# Altium footprint library pcb2D3D库101.PcbLib: 411 footprints (part 26 of 26)
Each footprint in its own frame and in the unit in brackets; x right, y up, seen from the top. Pads: shape width x height; smd on the part's side, far side on the other; paste and mask are expansions set on the pad; w line width, h text height; cw(c..) or ccw(c..) is an arc to the next point about the centre after c.
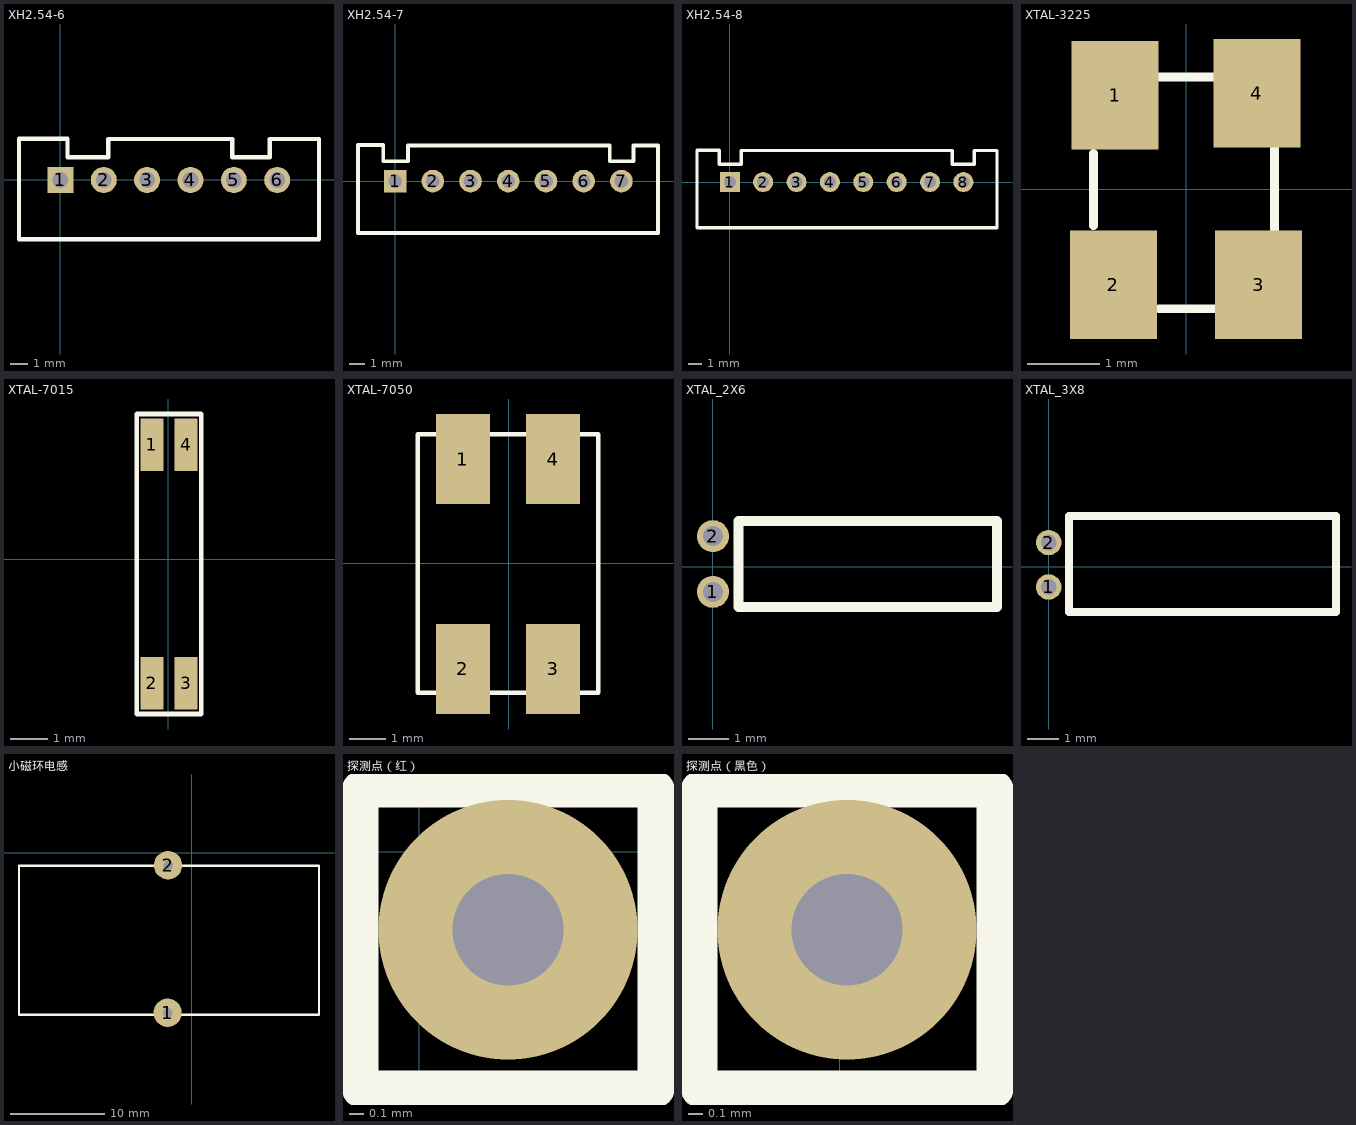
[diagram p25: the footprints below, top view; thin cyan lines are the x and y axes]

## XH2.54-6 [mm]
pads (6):
  rect 1.5x1.5 hole 0.9: 1(0,0)
  round 1.5 hole 0.9: 2(2.5,0) 3(5,0) 4(7.5,0) 5(10,0) 6(12.5,0)
TopOverlay:
  lines w0.254: -2.388,-3.429 14.91,-3.429 14.91,2.362 12.065,2.362 12.065,1.321 9.906,1.321 9.906,2.362 2.769,2.362 2.769,1.321 0.406,1.321 0.406,2.388 -2.388,2.388 -2.388,-3.429
3D body "6pin-2.5.step": height 7, standoff -3.4, extent -2.477,-3.383 14.923,2.367

## XH2.54-7 [mm]
pads (7):
  rect 1.5x1.5 hole 0.9: 1(0,0)
  round 1.5 hole 0.9: 2(2.5,0) 3(5,0) 4(7.5,0) 5(10,0) 6(12.5,0) 7(15,0)
TopOverlay:
  lines w0.254: -2.457,-3.429 17.424,-3.429 17.424,2.362 15.799,2.362 15.799,1.321 14.224,1.321 14.224,2.362 0.864,2.362 0.864,1.321 -0.787,1.321 -0.787,2.388 -2.457,2.388 -2.457,-3.429
3D body "XH7.step": height 7, standoff -3.4, extent -2.457,-3.388 17.443,2.362

## XH2.54-8 [mm]
pads (8):
  rect 1.5x1.5 hole 0.9: 1(0,0)
  round 1.5 hole 0.9: 2(2.5,0) 3(5,0) 4(7.5,0) 5(10,0) 6(12.5,0) 7(15,0) 8(17.5,0)
TopOverlay:
  lines w0.254: -2.457,-3.429 20.015,-3.429 20.015,2.362 18.313,2.362 18.313,1.321 16.662,1.321 16.662,2.362 0.864,2.362 0.864,1.321 -0.787,1.321 -0.787,2.388 -2.457,2.388 -2.457,-3.429
3D body "XH8.step": height 7, standoff -3.4, extent -2.462,-3.375 19.938,2.375

## XTAL-3225 [mm]
pads (4):
  rect 1.2x1.5 smd: 1(-0.978,1.295) 2(-1.003,-1.321) 3(1.003,-1.321) 4(0.978,1.321)
TopOverlay:
  lines w0.12: -1.278,-0.505 -1.278,0.495 ; -0.378,-1.655 0.422,-1.655 ; -0.378,1.545 0.422,1.545 ; 1.222,-0.605 1.222,0.595
3D body "XTAL-3225.STEP": height 0.8, standoff 0, extent -1.268,-1.651 1.232,1.549

## XTAL-7015 [mil]
pads (4):
  rect 23.62x55 smd: 1(-17,119) 2(-17,-129.03) 3(18.43,-129.03) 4(18.43,119)
TopOverlay:
  lines w4.72: -32.75,-161 34.18,-161 34.18,151 -32.75,151 -32.75,-161
3D body "xtal6713.STEP": height 51.18, standoff 0, extent -25,-148.9 26.18,136.9

## XTAL-7050 [mm]
pads (4):
  rect 1.5x2.5 smd: 1(-1.27,2.894) 2(-1.27,-2.922) 3(1.23,-2.922) 4(1.23,2.894)
TopOverlay:
  lines w0.12: -2.52,-3.581 -2.52,3.581 2.48,3.581 2.48,-3.581 -2.52,-3.581
3D body "XTAL-7050.STEP": height 1, standoff 0, extent -2.5,-3.449 2.5,3.551

## XTAL_2X6 [mm]
pads (2):
  round 0.8 hole 0.5: 1(0,-0.635) 2(0,0.762)
TopOverlay:
  lines w0.254: 0.635,-1.016 0.635,1.143 7.112,1.143 7.112,-1.016 0.635,-1.016
3D body: height 2, standoff 0, extent 0.912,-0.94 6.912,1.052

## XTAL_3X8 [mm]
pads (2):
  round 0.8 hole 0.5: 1(0,-0.635) 2(0,0.762)
TopOverlay:
  lines w0.254: 0.635,-1.422 9.042,-1.422 9.042,1.6 0.635,1.6 0.635,-1.422
3D body: height 3, standoff 0, extent 0.912,-1.436 8.912,1.552

## 小磁环电感 [mm]
pads (2):
  round 3 hole 1: 1(-2.565,-16.942) 2(-2.515,-1.321)
TopOverlay:
  lines w0.254: -18.288,-17.145 -18.288,-1.397 13.462,-1.397 13.462,-17.145 -18.288,-17.145
3D body: height 30.97, standoff 1.03, extent -17.498,-16.235 12.384,-2.235
3D body: height 14, standoff 0, extent -3.01,-1.82 -2.014,-0.822
3D body: height 14, standoff 0, extent -3.061,-17.441 -2.065,-16.443

## 探测点（红） [mm]
via 0.61,-0.533 diameter 1.778 hole 0.762
TopOverlay:
  lines w0.254: -0.406,-1.626 -0.406,0.432 1.626,0.432 1.626,-1.626 -0.406,-1.626
3D body: height 1, standoff -1, extent 0.114,-1.032 1.11,-0.034
3D body: height 2.5, standoff 0.5, extent -0.382,-1.531 1.61,0.465

## 探测点（黑色） [mm]
via 0.049,0.042 diameter 1.778 hole 0.762
TopOverlay:
  lines w0.254: -0.967,-1.051 1.065,-1.051 1.065,1.007 -0.967,1.007 -0.967,-1.051
3D body: height 2.5, standoff 0.5, extent -0.943,-0.956 1.049,1.04
3D body: height 1, standoff -1, extent -0.447,-0.457 0.549,0.541